# Altium footprint library LimeMicroAltiumLib_pcbLib_r01.PcbLib: 434 footprints (part 22 of 29)
Each footprint in its own frame and in the unit in brackets; x right, y up, seen from the top. Pads: shape width x height; smd on the part's side, far side on the other; paste and mask are expansions set on the pad; w line width, h text height; cw(c..) or ccw(c..) is an arc to the next point about the centre after c.
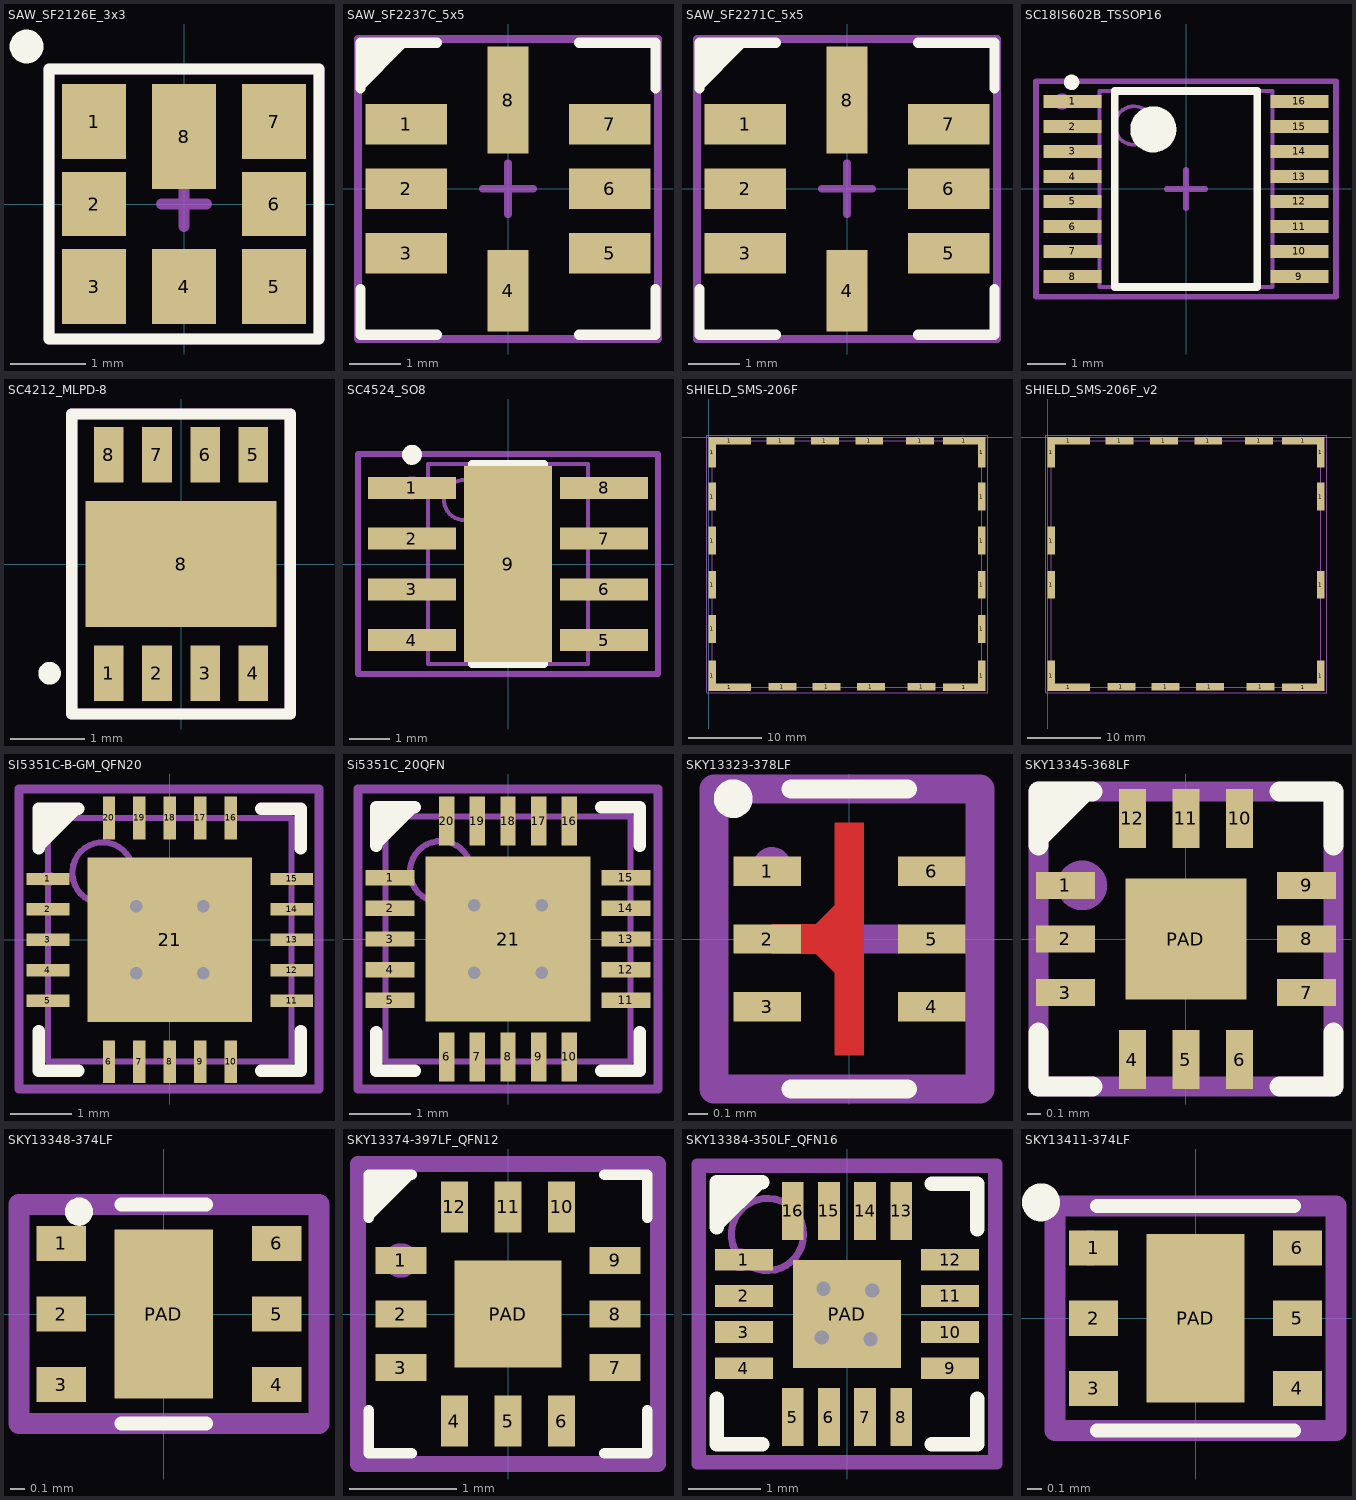
[diagram p21: the footprints below, top view; thin cyan lines are the x and y axes]

## SAW_SF2126E_3x3 [mm]
pads (8):
  rect 0.85x1 smd mask+0.05: 1(-1.2,1.1) 3(-1.2,-1.1) 4(0,-1.1) 5(1.2,-1.1) 7(1.2,1.1)
  rect 0.85x0.85 smd mask+0.05: 2(-1.2,0) 6(1.2,0)
  rect 0.85x1.4 smd mask+0.05: 8(0,0.9)
Top Overlay:
  circle w0.25: c-2.1,2.1 r0.1
  lines w0.15: -1.8,-1.8 -1.8,1.8 1.8,1.8 1.8,-1.8 -1.8,-1.8
Mechanical 15:
  circle w0.25: c-1.2,1.1 r0.1
  lines w0.15: -0.3,0 0.3,0 ; 0,-0.3 0,0.3 ; -1.8,-1.8 1.8,-1.8 1.8,1.8 -1.8,1.8 -1.8,-1.8
  text ".Designator" at 0,0 h0.55
3D body: height 1.15, standoff 0, extent -1.298,0.901 -0.9,1.3
3D body: height 1.1, standoff 0, extent -1.5,-1.5 1.5,1.5

## SAW_SF2237C_5x5 [mm]
pads (8):
  rect 1.6x0.8 smd mask+0.05: 1(-2,1.27) 2(-2,0) 3(-2,-1.27) 5(2,-1.27) 6(2,0) 7(2,1.27)
  rect 0.8x1.6 smd mask+0.05: 4(0,-2.005)
  rect 0.8x2.1 smd mask+0.05: 8(0,1.745)
Top Overlay:
  region: -2.9,1.9 -2,2.8 -2,2.9 -2.87,2.9 -2.9,2.87
  lines w0.2: -2.9,-1.97 -2.9,-2.87 -1.4,-2.87 ; -2.9,1.97 -2.9,2.87 -1.4,2.87 ; 1.4,-2.87 2.9,-2.87 2.9,-1.97 ; 1.4,2.87 2.9,2.87 2.9,1.97
Mechanical 15:
  circle w0.25: c-2,1.3 r0.1
  lines w0.15: -0.5,0 0.5,0 ; 0,-0.5 0,0.5 ; -2.95,-2.955 2.95,-2.955 2.95,2.945 -2.95,2.945 -2.95,-2.955
  text ".Designator" at 0,0 h0.55
3D body "User Library-TA0731.step": height 1.7, standoff 0, extent -2.5,-2.5 2.5,2.5

## SAW_SF2271C_5x5 [mm]
pads (8):
  rect 1.6x0.8 smd mask+0.05: 1(-2,1.27) 2(-2,0) 3(-2,-1.27) 5(2,-1.27) 6(2,0) 7(2,1.27)
  rect 0.8x1.6 smd mask+0.05: 4(0,-2.005)
  rect 0.8x2.1 smd mask+0.05: 8(0,1.745)
Top Overlay:
  region: -2.9,1.9 -2,2.8 -2,2.9 -2.87,2.9 -2.9,2.87
  lines w0.2: -2.9,-1.97 -2.9,-2.87 -1.4,-2.87 ; -2.9,1.97 -2.9,2.87 -1.4,2.87 ; 1.4,-2.87 2.9,-2.87 2.9,-1.97 ; 1.4,2.87 2.9,2.87 2.9,1.97
Mechanical 15:
  circle w0.25: c-2,1.3 r0.1
  lines w0.15: -0.5,0 0.5,0 ; 0,-0.5 0,0.5 ; -2.95,-2.955 -2.95,2.945 2.95,2.945 2.95,-2.955 -2.95,-2.955
  text ".Designator" at 0,0 h0.55
3D body "User Library-TA0731.step": height 1.7, standoff 0, extent -2.5,-2.5 2.5,2.5

## SC18IS602B_TSSOP16 [mm]
pads (16):
  rect 1.5x0.35 smd: 1(-2.95,2.275) 2(-2.95,1.625) 3(-2.95,0.975) 4(-2.95,0.325) 5(-2.95,-0.325) 6(-2.95,-0.975) 7(-2.95,-1.625) 8(-2.95,-2.275) 9(2.95,-2.275) 10(2.95,-1.625) 11(2.95,-0.975) 12(2.95,-0.325) 13(2.95,0.325) 14(2.95,0.975) 15(2.95,1.625) 16(2.95,2.275)
Top Overlay:
  circle w0.6: c-0.85,1.55 r0.3
  circle w0.25: c-2.975,2.775 r0.075
  lines w0.2: -1.85,-2.55 1.85,-2.55 1.85,2.55 -1.85,2.55 -1.85,-2.55
Mechanical 13:
  circle w0.1: c-1.35,1.65 r0.5
  lines w0.1: -2.25,-2.55 2.25,-2.55 2.25,2.55 -2.25,2.55 -2.25,-2.55
Mechanical 15:
  circle w0.35: c-3.225,2.275 r0.035
  lines w0.15: -0.5,0 0.5,0 ; 0,-0.5 0,0.5 ; -3.9,-2.8 3.9,-2.8 3.9,2.8 -3.9,2.8 -3.9,-2.8
  text ".Designator" at 0,0 h0.55
3D body "User Library-TSSOP-16-1.step": height 1.1, standoff 0, extent -3.2,-2.5 3.2,2.5

## SC4212_MLPD-8 [mm] "SC4212"
height 1.5
pads (9):
  rect 0.4x0.75 smd mask+0.05: 1(-0.975,-1.475) 2(-0.325,-1.475) 3(0.325,-1.475) 4(0.975,-1.475) 5(0.975,1.475) 6(0.325,1.475) 7(-0.325,1.475) 8(-0.975,1.475)
  rect 2.58x1.7 smd mask+0.05: 8(0,0)
Top Overlay:
  circle w0.254: c-1.775,-1.475 r0.025
  lines w0.15: -1.475,-2.025 -1.475,2.025 1.475,2.025 1.475,-2.025 -1.475,-2.025
Mechanical 15:
  circle w0.254: c-0.975,-1.475 r0.025
  lines w0.15: -0.45,0 0,0 ; 0,-0.45 0,0 ; 0,0.45 0,0 ; 0.45,0 0,0 ; -1.475,-2.025 -1.475,2.025 1.475,2.025 1.475,-2.025 -1.475,-2.025
  text ".Designator" at 0,0 h0.55
3D body: height 1.01, standoff 0, extent -1.2,-1.4 -0.8,-1
3D body: height 1, standoff 0, extent -1.5,-1.6 1.5,1.7

## SC4524_SO8 [mm] "SOIC, 8-Leads, Body 4,90x3,90mm, Pitch 1,27mm, IPC Medium Density"
height 1.7
pads (9):
  rect 2.2x0.55 smd mask+0.05: 1(-2.4,1.905) 2(-2.4,0.635) 3(-2.4,-0.635) 4(-2.4,-1.905) 5(2.4,-1.905) 6(2.4,-0.635) 7(2.4,0.635) 8(2.4,1.905)
  rect 2.2x4.9 smd mask+0.05: 9(0,0)
Top Overlay:
  circle w0.25: c-2.4,2.73 r0.125
  lines w0.2: -0.9,-2.5 0.9,-2.5 0.9,2.5 -0.9,2.5 -0.9,-2.5
Mechanical 13:
  circle w0.1: c-1.1,1.6 r0.5
  lines w0.1: -2,-2.5 2,-2.5 2,2.5 -2,2.5 -2,-2.5
Mechanical 15:
  circle w0.35: c-2.4,1.905 r0.112
  lines w0.15: -0.5,0 0.5,0 ; 0,-0.5 0,0.5 ; -3.75,-2.75 3.75,-2.75 3.75,2.75 -3.75,2.75 -3.75,-2.75
  text ".Designator" at 0,-0.1 h0.55
3D body "CircuitWorks-SO-8.step": height 1.45, standoff 0, extent -2.9,-2.402 2.878,2.5

## SHIELD_SMS-206F [mm] "RF Shield  Frame+Cover 1.348\" (34.24mm) X 1.472\" (37.39mm) Vented Surface Mount"
pads (24):
  rect 1x4.14 smd mask+0.05: 1(0.5,-32.402) 1(0.5,-2.075) 1(37.143,-32.402) 1(37.143,-2.075)
  rect 1x3.785 smd mask+0.05: 1(0.5,-26.055) 1(0.5,-20.06) 1(0.5,-14.065) 1(0.5,-8.07) 1(37.143,-26.055) 1(37.143,-20.06) 1(37.143,-14.065) 1(37.143,-8.07)
  rect 5.715x1 smd mask+0.05: 1(2.9,-33.977) 1(2.9,-0.5) 1(34.743,-33.977) 1(34.743,-0.5)
  rect 3.81x1 smd mask+0.05: 1(9.8,-0.5) 1(10.025,-33.925) 1(28.75,-0.5) 1(28.975,-33.925)
  rect 3.785x1 smd mask+0.05: 1(15.825,-0.5) 1(16.05,-33.925) 1(21.85,-0.5) 1(22.075,-33.925)
Mechanical 13:
  lines w0.1: 0.5,-33.977 0.5,-0.5 37.143,-0.5 37.143,-33.977 0.5,-33.977
Mechanical 15:
  lines w0.15: -0.25,-34.75 -0.25,0.275 37.925,0.275 37.925,-34.75 -0.25,-34.75
  text ".Designator" at 18.375,-17.15 h0.55
  text "RF shield" at 31.15,-33.05 h0.55

## SHIELD_SMS-206F_v2 [mm] "RF Shield  Frame+Cover 1.348\" (34.24mm) X 1.472\" (37.39mm) Vented Surface Mount"
pads (20):
  rect 1x4.14 smd mask+0.05: 1(0.5,-32.402) 1(0.5,-2.075) 1(37.143,-32.402) 1(37.143,-2.075)
  rect 1x3.785 smd mask+0.05: 1(0.5,-20.06) 1(0.5,-14.065) 1(37.143,-20.06) 1(37.143,-8.07)
  rect 5.715x1 smd mask+0.05: 1(2.9,-33.977) 1(2.9,-0.5) 1(34.743,-33.977) 1(34.743,-0.5)
  rect 3.81x1 smd mask+0.05: 1(9.8,-0.5) 1(10.025,-33.925) 1(28.75,-0.5) 1(28.975,-33.925)
  rect 3.785x1 smd mask+0.05: 1(15.825,-0.5) 1(16.05,-33.925) 1(21.85,-0.5) 1(22.075,-33.925)
Mechanical 13:
  lines w0.1: 0.5,-33.977 37.143,-33.977 37.143,-0.5 0.5,-0.5 0.5,-33.977
Mechanical 15:
  lines w0.15: -0.25,-34.75 37.925,-34.75 37.925,0.275 -0.25,0.275 -0.25,-34.75
  text "RF shield" at 31.15,-33.05 h0.55
  text ".Designator" at 18.375,-17.15 h0.55

## SI5351C-B-GM_QFN20 [mm] "QFN, 20-Leads, Body 4,00x4,00mm, Pitch 0,50mm, Thermal Pad 2,70x2,70mm, IPC Medium Density"
height 0.85
pads (21):
  rect 0.7x0.2 smd mask+0.05: 1(-2,1) 2(-2,0.5) 3(-2,0) 4(-2,-0.5) 5(-2,-1) 11(2,-1) 12(2,-0.5) 13(2,0) 14(2,0.5) 15(2,1)
  rect 0.2x0.7 smd mask+0.05: 6(-1,-2) 7(-0.5,-2) 8(0,-2) 9(0.5,-2) 10(1,-2) 16(1,2) 17(0.5,2) 18(0,2) 19(-0.5,2) 20(-1,2)
  rect 2.7x2.7 smd mask+0.05: 21(0,0)
via 0.55,-0.55 diameter 0.5 hole 0.2
via -0.55,-0.55 diameter 0.5 hole 0.2
via 0.55,0.55 diameter 0.5 hole 0.2
via -0.55,0.55 diameter 0.5 hole 0.2
Top Overlay:
  region: -2.15,1.4 -1.4,2.15 -2.15,2.15
  lines w0.2: -2.15,-1.5 -2.15,-2.15 -1.5,-2.15 ; -2.15,1.5 -2.15,2.15 -1.5,2.15 ; 1.5,-2.15 2.15,-2.15 2.15,-1.5 ; 1.5,2.15 2.15,2.15 2.15,1.5
Mechanical 13:
  circle w0.1: c-1.1,1.1 r0.5
  lines w0.1: -2,-2 2,-2 2,2 -2,2 -2,-2
Mechanical 15:
  circle w0.15: c-2,1 r0.05
  lines w0.15: -0.5,0 0.5,0 ; 0,-0.5 0,0.5 ; -2.475,-2.45 2.45,-2.45 2.45,2.475 -2.475,2.475 -2.475,-2.45
  text ".Designator" at 0,0 h0.55
3D body "User Library-QFN4x4_20pins.step": height 0.8, standoff 0, extent -2.02,-2.02 2.02,2.02

## Si5351C_20QFN [mm] "QFN, 20-Leads, Body 4,00x4,00mm, Pitch 0,50mm, Thermal Pad 2,70x2,70mm, IPC Medium Density"
height 0.8
pads (21):
  rect 0.8x0.25 smd mask+0.05: 1(-1.925,1) 2(-1.925,0.5) 3(-1.925,0) 4(-1.925,-0.5) 5(-1.925,-1) 11(1.925,-1) 12(1.925,-0.5) 13(1.925,0) 14(1.925,0.5) 15(1.925,1)
  rect 0.25x0.8 smd mask+0.05: 6(-1,-1.925) 7(-0.5,-1.925) 8(0,-1.925) 9(0.5,-1.925) 10(1,-1.925) 16(1,1.925) 17(0.5,1.925) 18(0,1.925) 19(-0.5,1.925) 20(-1,1.925)
  rect 2.7x2.7 smd mask+0.05: 21(0,0)
via -0.55,0.55 diameter 0.4 hole 0.2
via 0.55,0.55 diameter 0.4 hole 0.2
via -0.55,-0.55 diameter 0.4 hole 0.2
via 0.55,-0.55 diameter 0.4 hole 0.2
Top Overlay:
  region: -2.15,1.425 -1.425,2.15 -2.15,2.15
  lines w0.2: -2.15,-1.525 -2.15,-2.15 -1.525,-2.15 ; -2.15,1.525 -2.15,2.15 -1.525,2.15 ; 1.525,-2.15 2.15,-2.15 2.15,-1.525 ; 1.525,2.15 2.15,2.15 2.15,1.525
Mechanical 13:
  circle w0.1: c-1.1,1.1 r0.5
  lines w0.1: -2,-2 -2,2 2,2 2,-2 -2,-2
Mechanical 15:
  lines w0.15: -0.5,0 0.5,0 ; 0,-0.5 0,0.5 ; -2.45,-2.45 -2.45,2.45 2.45,2.45 2.45,-2.45 -2.45,-2.45
  text ".Designator" at 0,0 h0.55
3D body "User Library-QFN4x4_20pins.step": height 0.8, standoff 0, extent -2.02,-2.02 2.02,2.02

## SKY13323-378LF [mm] "SKY13323-378LF RF switch"
pads (6):
  rect 0.35x0.15 smd paste-0.1 mask+0.05: 1(-0.425,0.35) 2(-0.425,0) 3(-0.425,-0.35) 4(0.425,-0.35) 5(0.425,0) 6(0.425,0.35)
Top Layer:
  region: -0.4,0.075 -0.175,0.075 -0.075,0.175 -0.075,0.6 0.075,0.6 0.075,0 -0.4,0
  region: -0.4,-0.075 -0.175,-0.075 -0.075,-0.175 -0.075,-0.6 0.075,-0.6 0.075,0 -0.4,0
Top Overlay:
  circle w0.1: c-0.6,0.725 r0.05
  lines w0.1: -0.3,-0.775 0.3,-0.775 ; -0.3,0.775 0.3,0.775
Top Paste:
  drawing of 24 lines, arcs and shapes, not listed
Mechanical 15:
  circle w0.1: c-0.4,0.375 r0.05
  lines w0.15: -0.25,0 0,0 ; 0,-0.25 0,0 ; 0,0.25 0,0 ; 0.25,0 0,0 ; -0.7,-0.775 0.675,-0.775 0.675,0.775 -0.7,0.775 -0.7,-0.775
  text ".Designator" at 0,0 h0.55
3D body: height 0.5, standoff 0, extent -0.5,-0.5 0.5,0.5
3D body: height 0.51, standoff 0.5, extent -0.425,0.225 -0.225,0.425

## SKY13345-368LF [mm]
pads (13):
  rect 0.44x0.2 smd mask+0.05: 1(-0.9,0.4) 2(-0.9,0) 3(-0.9,-0.4) 7(0.9,-0.4) 8(0.9,0) 9(0.9,0.4)
  rect 0.2x0.44 smd mask+0.05: 4(-0.4,-0.9) 5(0,-0.9) 6(0.4,-0.9) 10(0.4,0.9) 11(0,0.9) 12(-0.4,0.9)
  rect 0.9x0.9 smd mask+0.05: PAD(0,0)
Top Overlay:
  region: -1.1,0.65 -0.65,1.1 -1.1,1.1
  lines w0.15: -1.1,-0.7 -1.1,-1.1 -0.7,-1.1 ; -1.1,0.7 -1.1,1.1 -0.7,1.1 ; 0.7,-1.1 1.1,-1.1 1.1,-0.7 ; 0.7,1.1 1.1,1.1 1.1,0.7
Mechanical 15:
  circle w0.3: c-0.775,0.4 r0.035
  lines w0.15: -0.2,0 0.2,0 ; 0,-0.2 0,0.2 ; -1.1,-1.1 1.1,-1.1 1.1,1.1 -1.1,1.1 -1.1,-1.1
  text ".Designator" at 0,0 h0.55
3D body: height 0.56, standoff 0, extent -0.849,0.65 -0.65,0.85
3D body: height 0.55, standoff 0, extent -1,-1 1,1

## SKY13348-374LF [mm] "SKY13348-374LF RF switch"
pads (7):
  rect 0.35x0.25 smd mask+0.05: 1(-0.725,0.5) 2(-0.725,0) 3(-0.725,-0.5) 4(0.8,-0.5) 5(0.8,0) 6(0.8,0.5)
  rect 0.7x1.2 smd mask+0.05: PAD(0,0)
Top Overlay:
  circle w0.1: c-0.6,0.725 r0.05
  lines w0.1: -0.3,-0.775 0.3,-0.775 ; -0.3,0.775 0.3,0.775
Mechanical 15:
  circle w0.1: c-0.75,0.5 r0.05
  lines w0.15: -0.25,0 0,0 ; 0,-0.25 0,0 ; 0,0.25 0,0 ; 0.25,0 0,0 ; -1.025,-0.775 1.1,-0.775 1.1,0.775 -1.025,0.775 -1.025,-0.775
  text ".Designator" at 0,0 h0.55
3D body: height 0.5, standoff 0, extent -0.725,-0.75 0.775,0.75
3D body: height 0.51, standoff 0.5, extent -0.625,0.45 -0.425,0.65

## SKY13374-397LF_QFN12 [mm]
pads (13):
  rect 0.475x0.25 smd mask+0.05: 1(-1,0.5) 2(-1,0) 3(-1,-0.5) 7(1,-0.5) 8(1,0) 9(1,0.5)
  rect 0.25x0.475 smd mask+0.05: 4(-0.5,-1) 5(0,-1) 6(0.5,-1) 10(0.5,1) 11(0,1) 12(-0.5,1)
  rect 1x1 smd mask+0.05: PAD(0,0)
Top Overlay:
  region: -1.3,0.85 -0.85,1.3 -1.3,1.3
  lines w0.1: -1.3,-0.9 -1.3,-1.3 -0.9,-1.3 ; -1.3,0.9 -1.3,1.3 -0.9,1.3 ; 0.9,-1.3 1.3,-1.3 1.3,-0.9 ; 0.9,1.3 1.3,1.3 1.3,0.9
Mechanical 15:
  circle w0.25: c-1,0.5 r0.035
  lines w0.15: -0.2,0 0.2,0 ; 0,-0.2 0,0.2 ; -1.4,-1.4 1.4,-1.4 1.4,1.4 -1.4,1.4 -1.4,-1.4
  text ".Designator" at 0,0 h0.55
3D body: height 0.55, standoff 0, extent -1,-1 1,1
3D body: height 0.58, standoff 0.53, extent -0.873,0.476 -0.475,0.875

## SKY13384-350LF_QFN16 [mm]
pads (17):
  rect 0.8x0.3 smd mask+0.05: 1(-1.425,0.75) 2(-1.425,0.25) 3(-1.425,-0.25) 4(-1.425,-0.75) 9(1.425,-0.75) 10(1.425,-0.25) 11(1.425,0.25) 12(1.425,0.75)
  rect 0.3x0.8 smd mask+0.05: 5(-0.75,-1.425) 6(-0.25,-1.425) 7(0.25,-1.425) 8(0.75,-1.425) 13(0.75,1.425) 14(0.25,1.425) 15(-0.25,1.425) 16(-0.75,1.425)
  rect 1.5x1.5 smd mask+0.05: PAD(0,0)
via 0.35,0.325 diameter 0.4 hole 0.2
via 0.325,-0.35 diameter 0.4 hole 0.2
via -0.35,-0.325 diameter 0.4 hole 0.2
via -0.325,0.35 diameter 0.4 hole 0.2
Top Overlay:
  region: -1.8,1.1 -1.075,1.825 -1.8,1.825
  lines w0.2: -1.8,-1.175 -1.8,-1.8 -1.175,-1.8 ; -1.8,1.2 -1.8,1.825 -1.175,1.825 ; 1.175,-1.8 1.8,-1.8 1.8,-1.175 ; 1.175,1.8 1.8,1.8 1.8,1.175
Mechanical 13:
  circle w0.1: c-1.1,1.1 r0.5
  lines w0.1: -2,-2 2,-2 2,2 -2,2 -2,-2
Mechanical 15:
  circle w0.2: c-1.475,0.75 r0.056
  lines w0.15: -0.5,0 0.5,0 ; 0,-0.5 0,0.5 ; -2.075,-2.075 2.075,-2.075 2.075,2.075 -2.075,2.075 -2.075,-2.075
  text ".Designator" at 0,0 h0.55
3D body "User Library-qfn16-3x3.step": height 0.92, standoff 0, extent -1.5,-1.5 1.5,1.5

## SKY13411-374LF [mm]
pads (7):
  rect 0.35x0.25 smd mask+0.05: 1(-0.725,0.5) 2(-0.725,0) 3(-0.725,-0.5) 4(0.725,-0.5) 5(0.725,0) 6(0.725,0.5)
  rect 0.7x1.2 smd mask+0.05: PAD(0,0)
Top Overlay:
  circle w0.2: c-1.1,0.825 r0.035
  lines w0.1: -0.7,-0.8 0.7,-0.8 ; -0.7,0.8 0.7,0.8
Mechanical 15:
  circle w0.2: c-0.75,0.5 r0.025
  lines w0.15: -0.2,0 0.2,0 ; 0,-0.2 0,0.2 ; -1,-0.8 1,-0.8 1,0.8 -1,0.8 -1,-0.8
  text ".Designator" at 0,0 h0.55
3D body "User Library-DFN 6 2x2_v2.STEP": height 0.48, standoff -0.03, extent -0.752,-0.75 0.751,0.75